# Altium footprint library Generic Footprint.PcbLib: 160 footprints (part 20 of 20)
Each footprint in its own frame and in the unit in brackets; x right, y up, seen from the top. Pads: shape width x height; smd on the part's side, far side on the other; paste and mask are expansions set on the pad; w line width, h text height; cw(c..) or ccw(c..) is an arc to the next point about the centre after c.
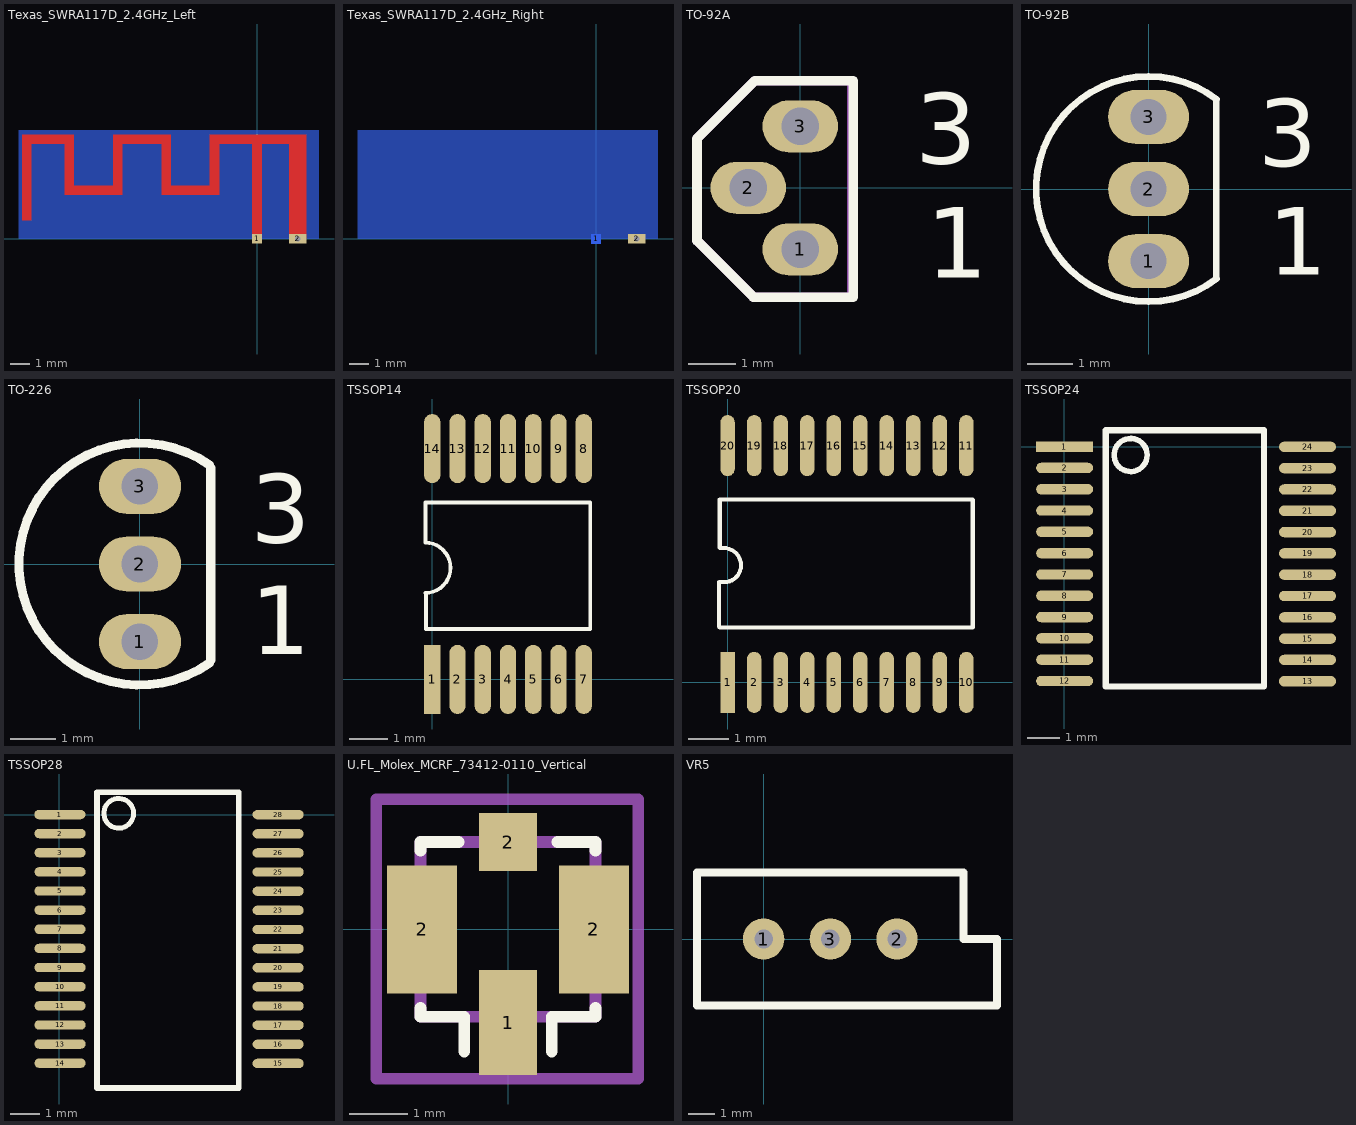
[diagram p19: the footprints below, top view; thin cyan lines are the x and y axes]

## Texas_SWRA117D_2.4GHz_Left [mm] "2.4G Antenna"
pads (2):
  rect 0.5x0.5 smd: 1(0,0)
  rect 0.9x0.5 hole 0.3: 2(2.1,0)
Top Layer:
  rectangle: -12.15,0.96 -11.65,5.4
  rectangle: -12.15,4.9 -9.45,5.4
  rectangle: -9.95,2.26 -9.45,5.4
  rectangle: -9.95,2.26 -6.95,2.76
  rectangle: -7.45,2.26 -6.95,5.4
  rectangle: -7.45,4.9 -4.45,5.4
  rectangle: -4.95,2.26 -4.45,5.4
  rectangle: -4.95,2.26 -1.95,2.76
  rectangle: -2.45,2.26 -1.95,5.4
  rectangle: -0.25,0.008 0.25,5.392
  rectangle: -2.45,4.9 2.55,5.4
  rectangle: 1.65,0 2.55,5.4
Bottom Layer:
  pour cut-out: 2.1,0 3.2,0 3.2,5.6 -12.3,5.6 -12.3,0.008
Top Solder:
  rectangle: -12.3,-0.35 3.2,5.6
Bottom Solder:
  rectangle: -12.3,-0.35 3.2,5.6
Multi-Layer:
  pour cut-out: -12.3,0.008 -12.3,5.6 3.2,5.6 3.2,0

## Texas_SWRA117D_2.4GHz_Right [mm] "2.4G Antenna"
pads (2):
  rect 0.5x0.5 smd far side: 1(0,0)
  rect 0.9x0.5 hole 0.3: 2(2.1,0)
Bottom Layer:
  rectangle: -0.25,0.008 0.25,5.392
  rectangle: 1.65,0 2.55,5.4
  rectangle: -2.45,4.9 2.55,5.4
  rectangle: -2.45,2.26 -1.95,5.4
  rectangle: -4.95,2.26 -1.95,2.76
  rectangle: -4.95,2.26 -4.45,5.4
  rectangle: -7.45,4.9 -4.45,5.4
  rectangle: -7.45,2.26 -6.95,5.4
  rectangle: -9.95,2.26 -6.95,2.76
  rectangle: -9.95,2.26 -9.45,5.4
  rectangle: -12.15,4.9 -9.45,5.4
  rectangle: -12.15,0.96 -11.65,5.4
  pour cut-out: -12.3,0.008 -12.3,5.6 3.2,5.6 3.2,0.008 3.192,0
Top Overlay:
  pour cut-out: 2.1,0
Top Solder:
  rectangle: -12.3,-0.35 3.2,5.6
Bottom Solder:
  rectangle: -12.3,-0.35 3.2,5.6
Multi-Layer:
  pour cut-out: 2.1,0 3.192,0 3.2,0.008 3.2,5.6 -12.3,5.6 -12.3,0.008

## TO-92A [mm] "TO, Flat Index; 3 In-Line, Axial Leads; Body Dia. 4.5mm; Leads 0.51 x 0.48 mm (max)"
height 6.86
pads (3):
  oval 1.6x1.1 hole 0.8: 1(0,-1.3) 2(-1.1,0) 3(0,1.3)
Top Overlay:
  lines w0.203: -2.184,-1.118 -0.991,-2.311 1.118,-2.311 1.118,2.261 -0.965,2.261 -2.184,1.041 -2.184,-1.118
  text "1" at 2.66,-1.9 h1.5
  text "3" at 2.43,0.51 h1.5
Assembly Top:
  lines w0.203: -2.184,-1.118 -0.991,-2.311 1.092,-2.311 1.092,2.261 -0.965,2.261 -2.184,1.041 -2.184,-1.118
3D body: height 5.38, standoff -3.17, extent 1.5,-1.98 1.5,-1.98
3D body "TO-92A.step": height 4, standoff -3.41, extent -2.184,-2.311 1.118,2.261

## TO-92B [mm] "TO, Flat Index; 3 In-Line, Axial Leads; Body Dia. 4.5mm; Leads 0.51 x 0.48 mm (max)"
height 6.86
pads (3):
  oval 1.8x1.2 hole 0.8: 1(0,-1.6) 2(0,0) 3(0,1.6)
Top Overlay:
  lines w0.15: 1.5,-1.98 1.5,1.98 ; 1.51,-1.993 cw(c0,0) 1.51,1.993
  text "1" at 2.66,-1.9 h1.5
  text "3" at 2.43,0.51 h1.5
3D body "TO-92B.step": height 5.08, standoff -3.38, extent -2.286,-2.337 1.016,2.235

## TO-226 [mm] "TO, Flat Index; 3 In-Line, Axial Leads; Body Dia. 4.8mm; Leads 0.55 x 0.51 mm (max)"
height 5.33
pads (3):
  oval 1.8x1.2 hole 0.8: 1(0,-1.7) 2(0,0) 3(0,1.7)
Top Overlay:
  lines w0.2: 1.52,-2.171 cw(c0,0) 1.52,2.171 ; 1.55,-2.1 1.55,2.1
  text "3" at 2.421,0.467 h1.5
  text "1" at 2.421,-1.979 h1.5

## TSSOP14 [mm]
pads (14):
  rect 0.42x1.78 smd: 1(0,0)
  oval 0.42x1.78 smd: 2(0.65,0) 3(1.3,0) 4(1.95,0) 5(2.6,0) 6(3.25,0) 7(3.9,0) 8(3.9,5.94) 9(3.25,5.94) 10(2.6,5.94) 11(1.95,5.94) 12(1.3,5.94) 13(0.65,5.94) 14(0,5.94)
Top Overlay:
  lines w0.1: -0.179,3.523 cw(c-0.179,2.873) 0.471,2.873 cw(c-0.179,2.873) -0.179,2.223 cw(c-0.179,2.204) -0.161,2.204 -0.161,1.3 4.067,1.3 4.067,4.55 -0.171,4.55 -0.171,3.541

## TSSOP20 [mm]
pads (20):
  rect 0.35x1.5 smd: 1(0,0)
  oval 0.35x1.5 smd: 2(0.65,0) 3(1.3,0) 4(1.95,0) 5(2.6,0) 6(3.25,0) 7(3.9,0) 8(4.55,0) 9(5.2,0) 10(5.85,0) 11(5.85,5.8) 12(5.2,5.8) 13(4.55,5.8) 14(3.9,5.8) 15(3.25,5.8) 16(2.6,5.8) 17(1.95,5.8) 18(1.3,5.8) 19(0.65,5.8) 20(0,5.8)
Top Overlay:
  lines w0.1: -0.214,1.998 -0.214,2.447 -0.204,2.458 ; -0.214,2.186 -0.214,1.362 -0.193,1.341 5.996,1.341 6.006,1.351 6.006,4.472 5.996,4.482 -0.193,4.482 -0.193,3.303 ; -0.053,2.458 -0.204,2.458 ; -0.038,3.292 -0.183,3.292 ; -0.204,2.458 -0.079,2.458 ccw(c-0.079,2.865) 0.328,2.865 ccw(c-0.1,2.865) -0.1,3.292 -0.183,3.292 ; -0.193,3.303 -0.183,3.292 ; -0.193,3.303 -0.183,3.292

## TSSOP24 [mm]
pads (24):
  rect 1.75x0.32 smd: 1(0,0)
  oval 1.75x0.32 smd: 2(0.005,-0.65) 3(0.005,-1.304) 4(0.005,-1.958) 5(0.005,-2.613) 6(0.005,-3.268) 7(0.005,-3.922) 8(0.005,-4.577) 9(0.005,-5.231) 10(0.005,-5.886) 11(0.005,-6.54) 12(0.005,-7.194) 13(7.465,-7.202) 14(7.465,-6.547) 15(7.465,-5.892) 16(7.465,-5.238) 17(7.465,-4.584) 18(7.465,-3.929) 19(7.465,-3.275) 20(7.465,-2.62) 21(7.465,-1.966) 22(7.465,-1.311) 23(7.465,-0.657) 24(7.465,-0.002)
Top Overlay:
  circle w0.17: c2.031,-0.254 r0.509
  lines w0.19: 1.27,-7.366 1.27,0.508 6.124,0.508 6.124,-0.258 6.124,-7.366 1.27,-7.366

## TSSOP28 [mm]
pads (28):
  oval 1.75x0.32 smd: 1(0.014,-0.001) 2(0.019,-0.651) 3(0.019,-1.305) 4(0.019,-1.96) 5(0.019,-2.614) 6(0.019,-3.269) 7(0.019,-3.923) 8(0.019,-4.578) 9(0.019,-5.232) 10(0.019,-5.887) 11(0.019,-6.541) 12(0.019,-7.196) 13(0.019,-7.85) 14(0.019,-8.505) 15(7.479,-8.512) 16(7.479,-7.857) 17(7.479,-7.203) 18(7.479,-6.548) 19(7.479,-5.894) 20(7.479,-5.239) 21(7.479,-4.585) 22(7.479,-3.93) 23(7.479,-3.276) 24(7.479,-2.621) 25(7.479,-1.967) 26(7.479,-1.312) 27(7.479,-0.658) 28(7.479,-0.003)
Top Overlay:
  circle w0.17: c2.027,0.042 r0.509
  lines w0.19: 1.284,-9.353 1.284,0.763 6.138,0.763 6.138,-0.259 6.138,-9.353 1.284,-9.353

## U.FL_Molex_MCRF_73412-0110_Vertical [mm]
pads (4):
  rect 1x1.8 smd: 1(0,-1.6)
  rect 1.2x2.2 smd: 2(-1.475,0) 2(1.475,0)
  rect 1x1 smd: 2(0,1.5)
Top Overlay:
  lines w0.203: -1.5,-1.35 -1.5,-1.5 -0.75,-1.5 -0.75,-2.096 ; -1.5,1.35 -1.5,1.5 -0.85,1.5 ; 0.75,-2.096 0.75,-1.5 1.5,-1.5 1.5,-1.35 ; 0.85,1.5 1.5,1.5 1.5,1.35
Courtyard Top:
  lines w0.203: -2.261,-2.565 -2.261,2.235 2.235,2.235 2.235,-2.565 -2.261,-2.565
Assembly Top:
  lines w0.203: -1.5,-1.5 1.5,-1.5 1.5,1.5 -1.5,1.5 -1.5,-1.5
3D body "U.FL_Molex_MCRF_73412-0110_Vertical.step": height 1.25, standoff -0.01, extent -1.5,-1.55 1.5,1.55

## VR5 [mil]
pads (3):
  round 62 hole 28: 1(-0.27,0.07) 2(199.73,0.07) 3(99.73,0.07)
Top Overlay:
  lines w12: -100.27,-99.93 349.73,-99.93 349.73,0.07 299.73,0.07 299.73,100.07 -100.27,100.07 -100.27,-99.93